# Altium schematic symbol library 724452_RPL-HX_Mobile_AEP_Rev0p91_Library.SchLib: 162 symbols (part 1 of 5) (continued)
## C_MP2950 (continued)

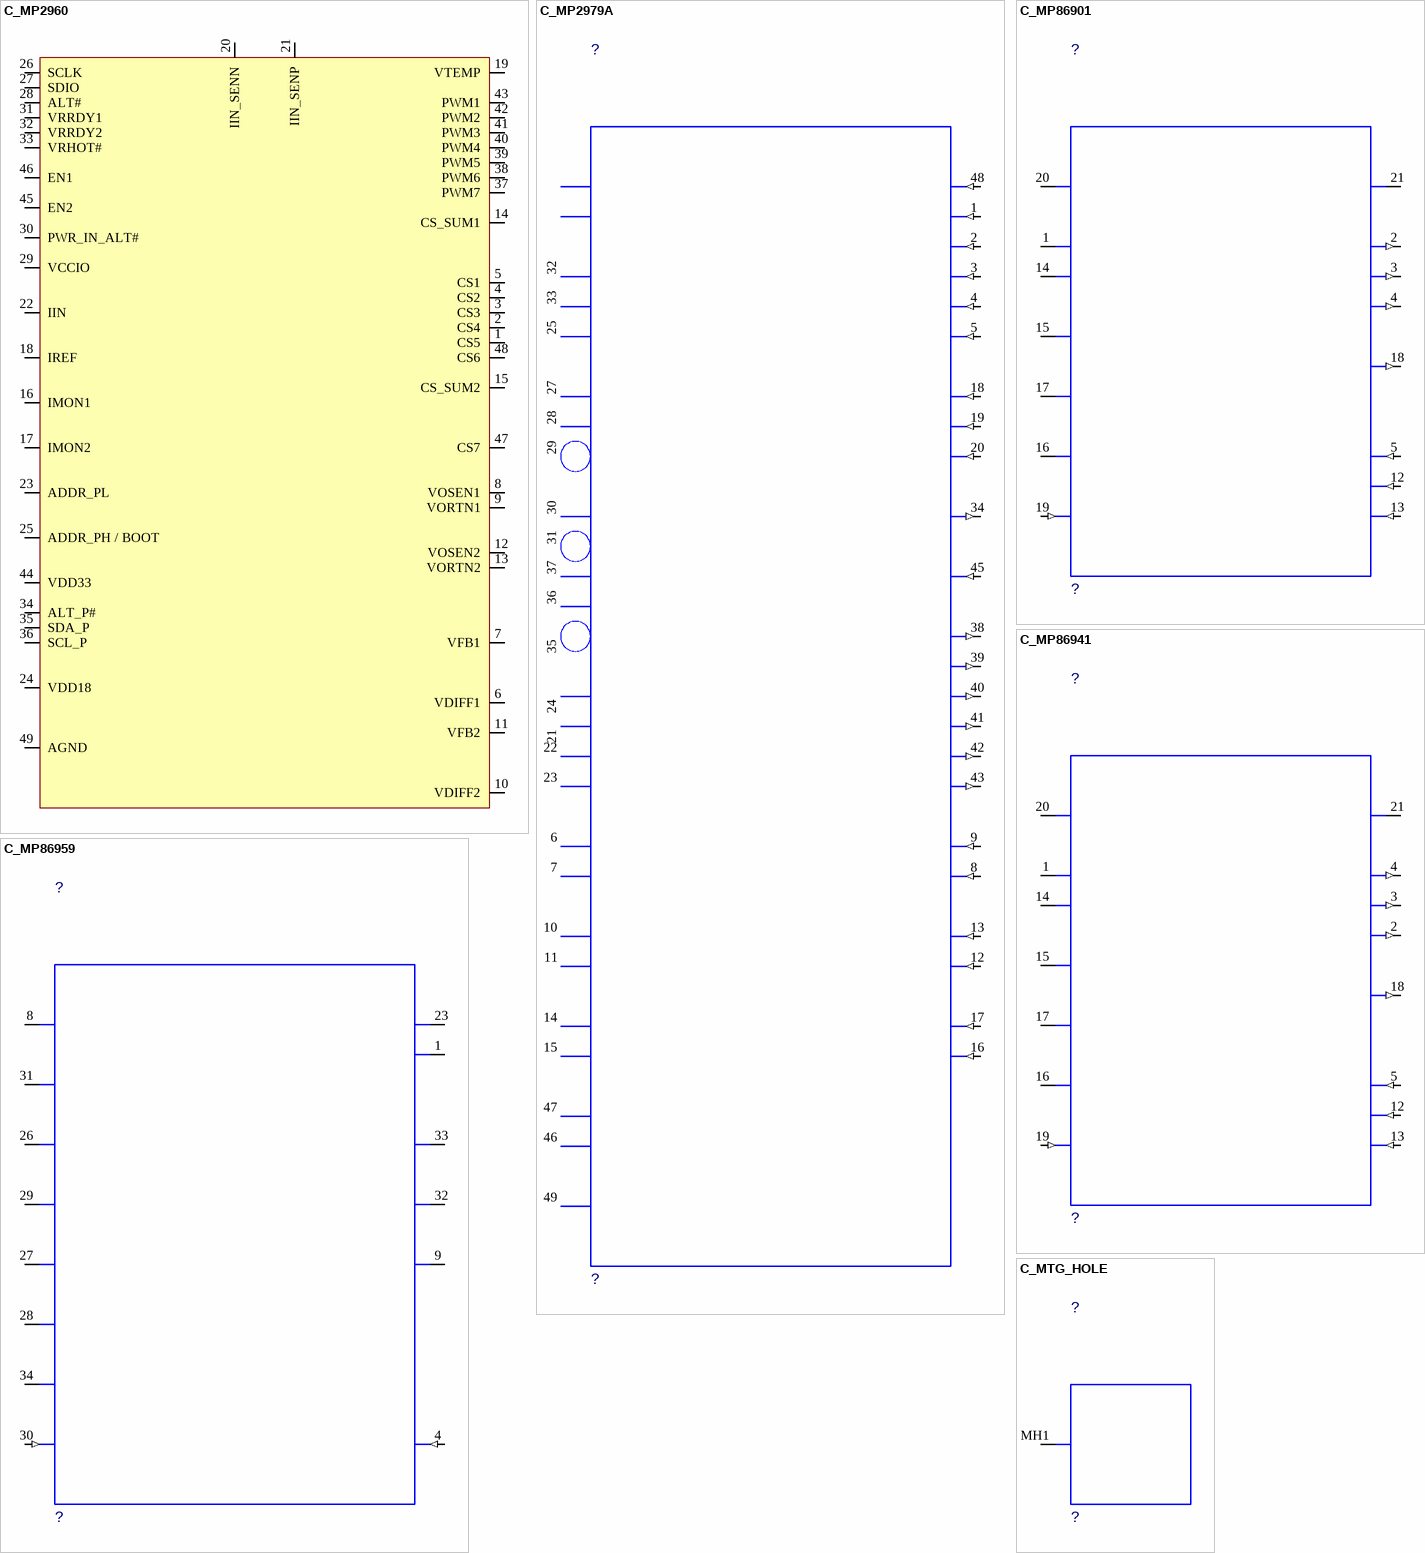
[diagram p11: symbols C_MP2960 to C_MTG_HOLE]

## C_MP2960
designator ?  (value not drawn)
Manufacturer Part Number: MP2965GQK; Case/Package: QFN-48 (6mmx6mm)
pins: 1 CS5, 2 CS4, 3 CS3, 4 CS2, 5 CS1, 6 VDIFF1, 7 VFB1, 8 VOSEN1, 9 VORTN1, 10 VDIFF2, 11 VFB2, 12 VOSEN2, 13 VORTN2, 14 CS_SUM1, 15 CS_SUM2, 16 IMON1, 17 IMON2, 18 IREF, 19 VTEMP, 20 IIN_SENN, 21 IIN_SENP, 22 IIN, 23 ADDR_PL, 24 VDD18, 25 ADDR_PH / BOOT, 26 SCLK, 27 SDIO, 28 ALT#, 29 VCCIO, 30 PWR_IN_ALT#, 31 VRRDY1, 32 VRRDY2, 33 VRHOT#, 34 ALT_P#, 35 SDA_P, 36 SCL_P, 37 PWM7, 38 PWM6, 39 PWM5, 40 PWM4, 41 PWM3, 42 PWM2, 43 PWM1, 44 VDD33, 45 EN2, 46 EN1, 47 CS7, 48 CS6, 49 AGND

## C_MP2979A
designator ?  (value not drawn)
CDS_LMAN_SYM_OUTLINE: -300,950,300,-950; ROOM: NONE; OriginalSymbolOrigin: (-350,950); FP_TECH: ?; IP: ?; PACK_TYPE: ?; VARIANT: ?; MATERIAL: ?; PART_NUMBER: ?
pins: 1 CS5 (in), 2 CS4 (in), 3 CS3 (in), 4 CS2 (in), 5 CS1 (in), 6 VDIFFA (out), 7 VFBA (io), 8 VOSENA (in), 9 VORTNA (in), 10 VDIFFB (out), 11 VFBB (io), 12 VOSENB (in), 13 VORTNB (in), 14 VDIFFC (out), 15 VFBC (io), 16 VOSENC (in), 17 VORTNC (in), 18 CS_SUMA (in), 19 CS_SUMB (in), 20 CS_SUMC (in), 21 IMONA (io), 22 IMONB (io), 23 IMONC (io), 24 IREF (io), 25 ADDR_P (io), 26 VDD18 (power) hidden to VDD18, 27 SCLK (in), 28 SDIO (io), 29 ALT_N (out), 30 VRRDY (out), 31 VRHOT_N (out), 32 SDA_P (io), 33 SCL_P (in), 34 STB (out), 35 SLP_S0_N (in), 36 PE (in), 37 EN (in), 38 PWM6 (out), 39 PWM5 (out), 40 PWM4 (out), 41 PWM3 (out), 42 PWM2 (out), 43 PWM1 (out), 44 VDD33 (power) hidden to VDD33, 45 TEMP (in), 46 PSYS (in), 47 VIN_SEN (in), 48 CS6 (in), 49 AGND_TPD (in)

## C_MP86901
designator ?  (value not drawn)
CDS_LMAN_SYM_OUTLINE: -250,400,250,-350; ROOM: NONE; OriginalSymbolOrigin: (-275,400); FP_TECH: ?; IP: ?; MATERIAL: ?; PACK_TYPE: ?; PART_NUMBER: ?; VARIANT: ?
pins: 1 VIN_1 (power), 2 SW_1 (out), 3 SW_2 (out), 4 SW_3 (out), 5 PGND_1 (in), 12 PGND_2 (in), 13 PGND_3 (in), 14 VIN_2 (power), 15 PWM (io), 16 SYNC (io), 17 VTEMP_FLT (io), 18 CS (out), 19 AGND (in), 20 VCC (power), 21 BST (io)

## C_MP86941
designator ?  (value not drawn)
CDS_LMAN_SYM_OUTLINE: -250,400,250,-350; ROOM: NONE; OriginalSymbolOrigin: (-275,400); FP_TECH: ?; IP: ?; MATERIAL: ?; PACK_TYPE: ?; PART_NUMBER: ?; VARIANT: ?
pins: 1 VIN_1 (power), 2 SW_1 (out), 3 SW_2 (out), 4 SW_3 (out), 5 PGND_1 (in), 12 PGND_2 (in), 13 PGND_3 (in), 14 VIN_2 (power), 15 PWM (io), 16 SYNC (io), 17 VTEMP_FLT (io), 18 CS (out), 19 AGND (in), 20 VCC (power), 21 BST (io)

## C_MP86959
designator ?  (value not drawn)
CDS_LMAN_SYM_OUTLINE: -300,450,300,-450; ROOM: NONE; OriginalSymbolOrigin: (-325,450); FP_TECH: ?; IP: ?; PACK_TYPE: ?; VARIANT: ?; MATERIAL: ?; PART_NUMBER: ?
pins: 1 VIN_1 (power), 4 PGND (in), 8 VDRV (io), 9 SW (io), 23 VIN_2 (power), 26 PWM (io), 27 SYNC (io), 28 CS (io), 29 VTEMP_FLT (io), 30 AGND (in), 31 VDD (power), 32 PHASE (io), 33 BST (io), 34 TEST (io)

## C_MTG_HOLE
designator ?  (value not drawn)
CDS_LMAN_SYM_OUTLINE: -100,100,100,-100; ROOM: NONE; OriginalSymbolOrigin: (-125,100); FP_TECH: ?; IP: ?; MATERIAL: ?; PACK_TYPE: ?; PART_NUMBER: ?; VARIANT: ?
pins: MH1 (io)

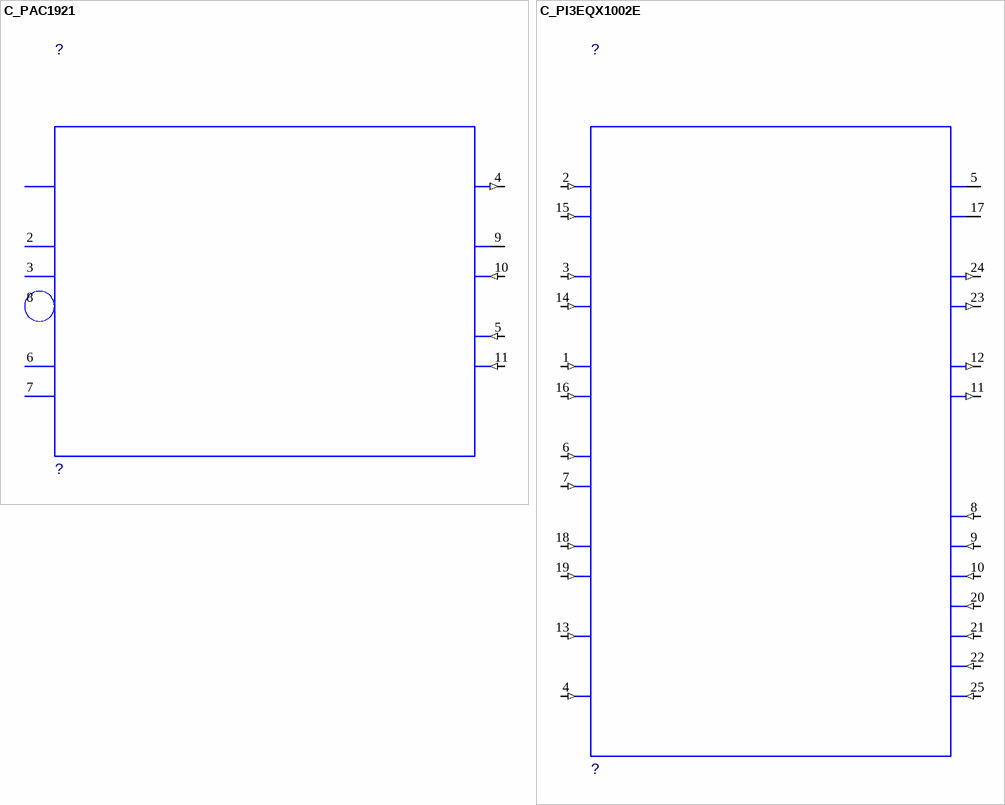
[diagram p12: symbols C_PAC1921 to C_PI3EQX1002E]

## C_PAC1921
designator ?  (value not drawn)
CDS_LMAN_SYM_OUTLINE: -350,250,350,-300; ROOM: NONE; OriginalSymbolOrigin: (-400,250); FP_TECH: ?; IP: ?; MATERIAL: ?; PACK_TYPE: ?; PART_NUMBER: ?; VARIANT: ?
pins: 1 VDD (power) hidden to VDD, 2 SENSE_DP (io), 3 SENSE_DN (io), 4 OUT (out), 5 GND (in), 6 ADDR_SEL (io), 7 RESERVED (io), 8 READ_N_INT (in), 9 SM_DATA (io), 10 SM_CLK (in), 11 THPAD (in)

## C_PI3EQX1002E
designator ?  (value not drawn)
CDS_LMAN_SYM_OUTLINE: -300,550,300,-500; ROOM: NONE; OriginalSymbolOrigin: (-325,550); FP_TECH: ?; IP: ?; MATERIAL: ?; PACK_TYPE: ?; PART_NUMBER: ?; VARIANT: ?
pins: 1 EQA (in), 2 FGA (in), 3 SWA (in), 4 EN (in), 5 VDD_1 (power), 6 AIP (in), 7 AIN (in), 8 GND_1 (in), 9 GND_2 (in), 10 GND_3 (in), 11 BON (out), 12 BOP (out), 13 RXDET_EN (in), 14 SWB (in), 15 FGB (in), 16 EQB (in), 17 VDD_2 (power), 18 BIP (in), 19 BIN (in), 20 GND_4 (in), 21 GND_5 (in), 22 GND_6 (in), 23 AON (out), 24 AOP (out), 25 GND_TPD (in)

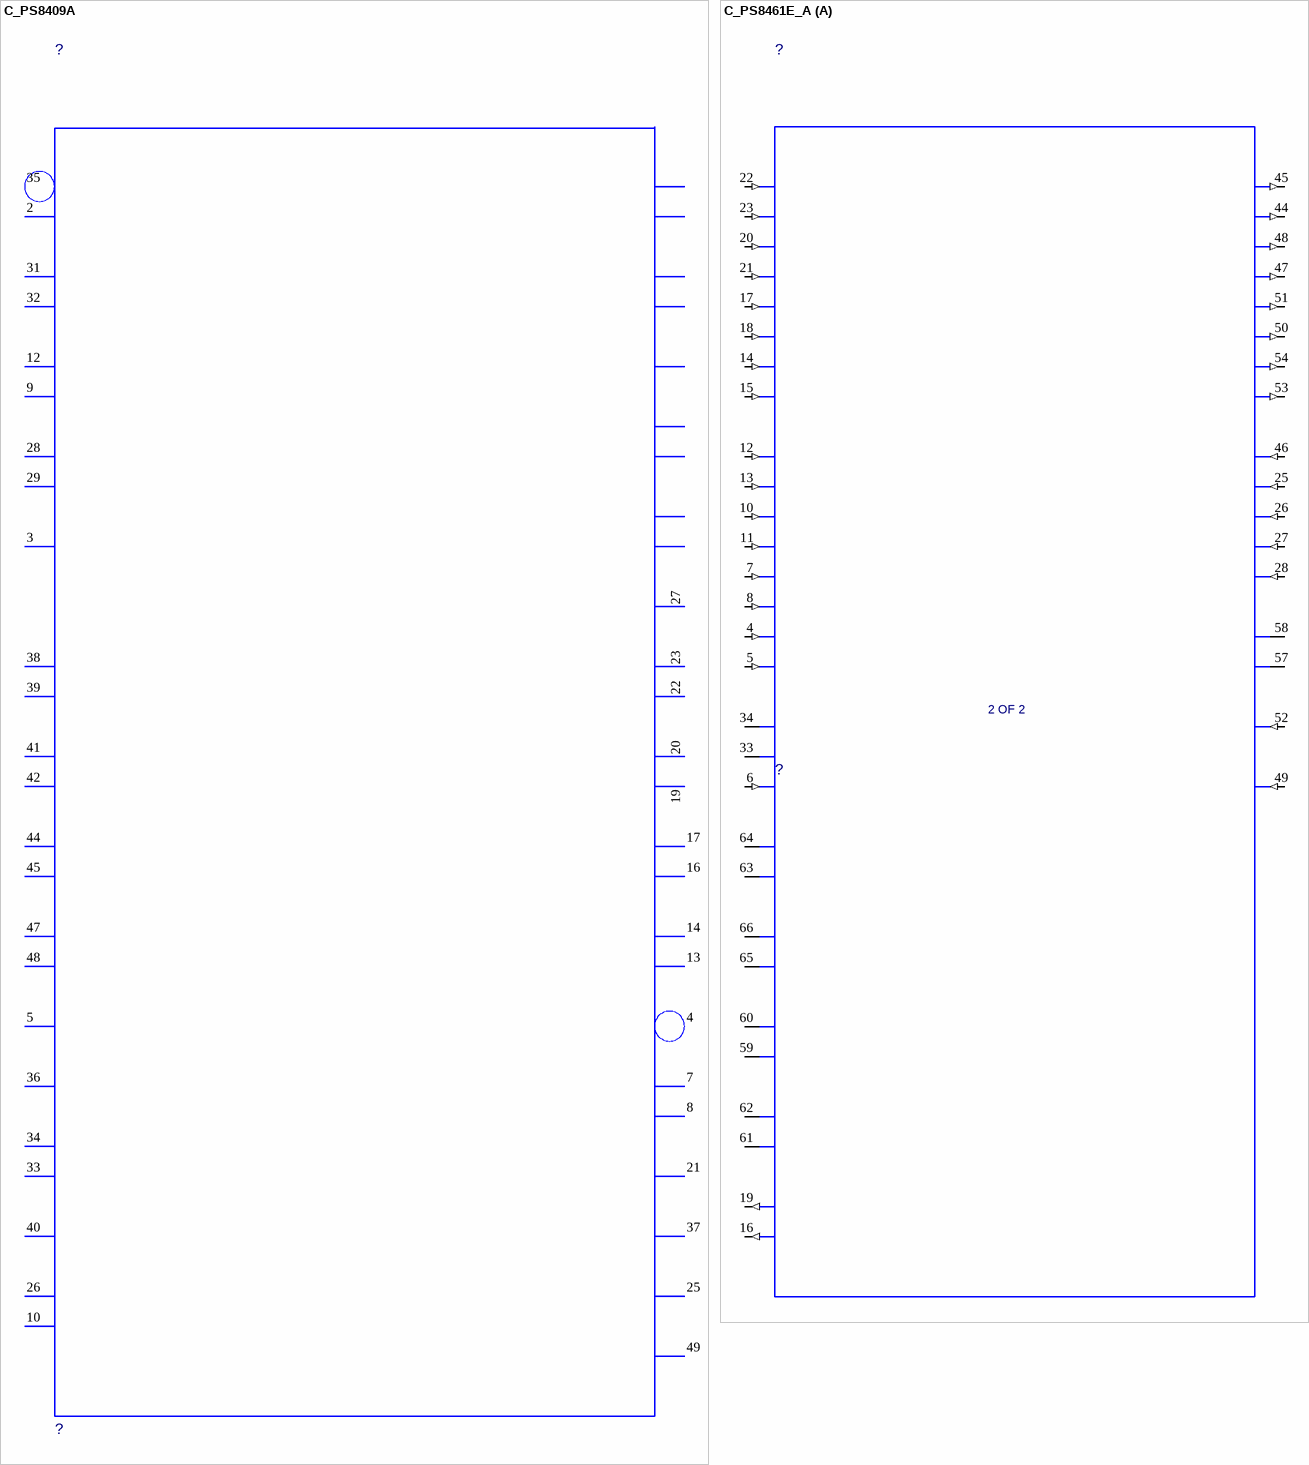
[diagram p13: symbols C_PS8409A to C_PS8461E_A]

## C_PS8409A
designator ?  (value not drawn)
CDS_LMAN_SYM_OUTLINE: -500,1050,500,-1100; ROOM: NONE; OriginalSymbolOrigin: (-550,1050); FP_TECH: ?; IP: ?; MATERIAL: ?; PACK_TYPE: ?; PART_NUMBER: ?; VARIANT: ?
pins: 1 VDD33_1 (power) hidden to VDD33_1, 2 TESTMODEB (in), 3 DCIN_ENB (in), 4 PDB (in), 5 EQ (in), 6 VDD12_1 (power) hidden to VDD12_1, 7 SCL_SNK (io), 8 SDA_SNK (io), 9 HDMI_CEC (io), 10 RSV1 (io), 11 VDDA12 (power) hidden to VDDA12, 12 CEC_EN (out), 13 OUT_CLKN (out), 14 OUT_CLKP (out), 15 VDDTX12_1 (power) hidden to VDDTX12_1, 16 OUT_D0N (out), 17 OUT_D0P (out), 18 VDDTX12_2 (power) hidden to VDDTX12_2, 19 OUT_D1N (out), 20 OUT_D1P (out), 21 HPD_SNK (in), 22 OUT_D2N (out), 23 OUT_D2P (out), 24 VDD33_2 (power) hidden to VDD33_2, 25 NC (io), 26 RSV2 (io), 27 PRE (in), 28 CSDA (io), 29 CSCL (io), 30 VDD12_2 (power) hidden to VDD12_2, 31 I2C_ADDR (in), 32 HDMI_ID (in), 33 SDA_SRC_AUXN (io), 34 SCL_SRC_AUXP (io), 35 RESETB (in), 36 REXT (in), 37 POWERSWITCH (out), 38 IN_D2P (in), 39 IN_D2N (in), 40 HPD_SRC (out), 41 IN_D1P (in), 42 IN_D1N (in), 43 VDDRX12_1 (power) hidden to VDDRX12_1, 44 IN_D0P (in), 45 IN_D0N (in), 46 VDDRX12_2 (power) hidden to VDDRX12_2, 47 IN_CLKP (in), 48 IN_CLKN (in), 49 THPAD (in)

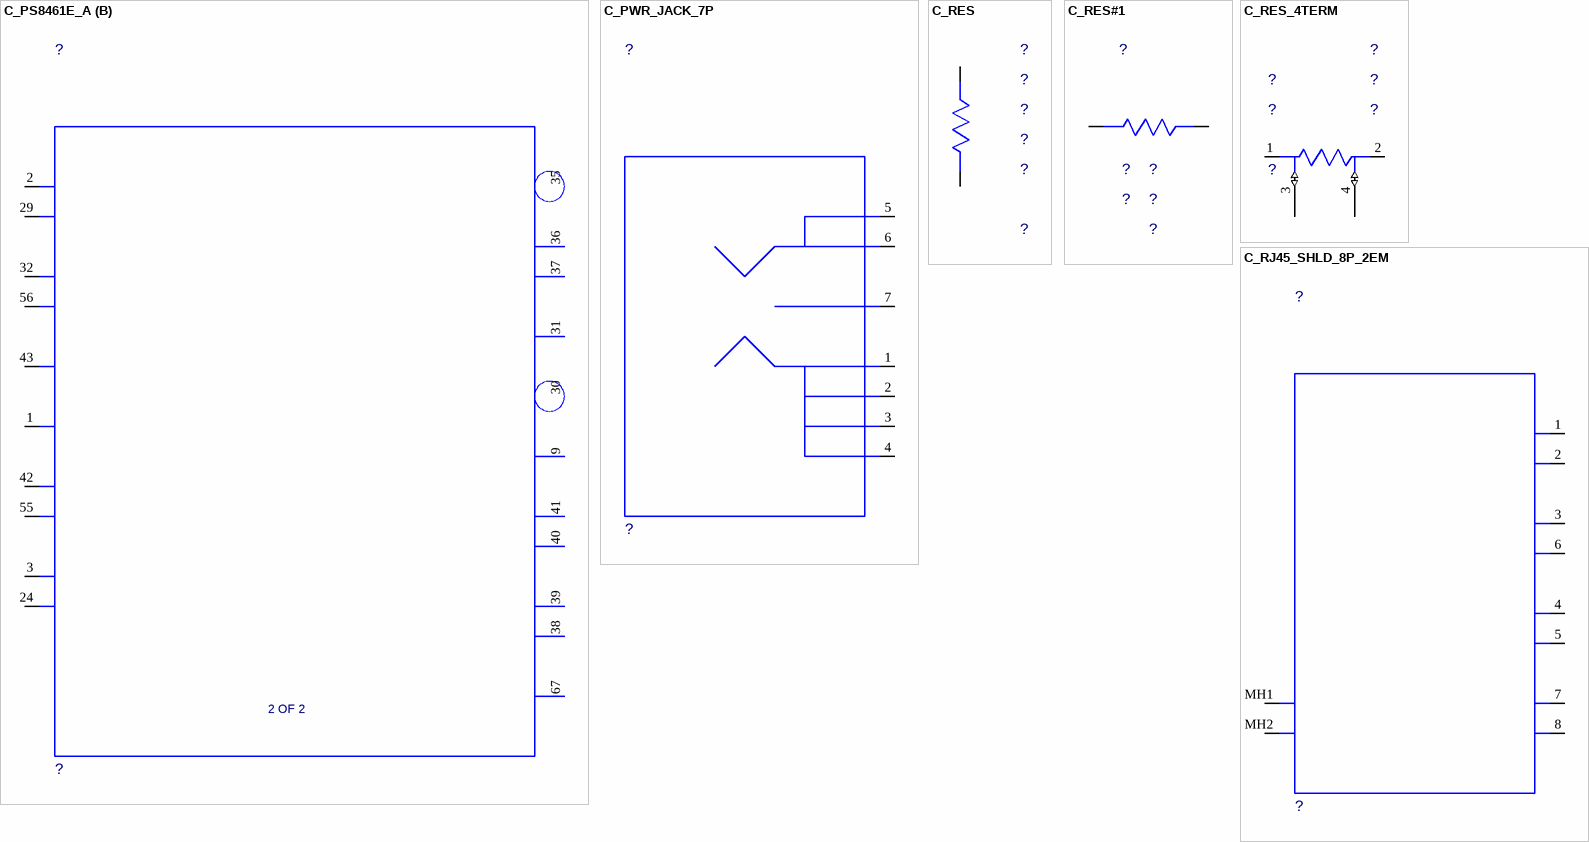
[diagram p14: symbols C_PS8461E_A to C_RJ45_SHLD_8P_2EM]

## C_PS8461E_A
designator ?  PART_SYM_NUM: 2 OF 2  (hidden comment: C_PS8461E_A)
CDS_LMAN_SYM_OUTLINE: -400,500,400,-550; ROOM: NONE; OriginalSymbolOrigin: (-425,500); FP_TECH: ?; IP: ?; PACK_TYPE: ?; VARIANT: ?; MATERIAL: ?; PART_NUMBER: ?
part A pins: 4 IN1_D0P (in), 5 IN1_D0N (in), 6 I2C_ADDR (in), 7 IN1_D1P (in), 8 IN1_D1N (in), 10 IN1_D2P (in), 11 IN1_D2N (in), 12 IN1_D3P (in), 13 IN1_D3N (in), 14 IN2_D0P (in), 15 IN2_D0N (in), 16 IN1_HPD (out), 17 IN2_D1P (in), 18 IN2_D1N (in), 19 IN2_HPD (out), 20 IN2_D2P (in), 21 IN2_D2N (in), 22 IN2_D3P (in), 23 IN2_D3N (in), 25 CFG3 (in), 26 CFG2 (in), 27 CFG1 (in), 28 CFG0 (in), 33 CSDA (io), 34 CSCL (io), 44 OUT_D3N (out), 45 OUT_D3P (out), 46 CFG4 (in), 47 OUT_D2N (out), 48 OUT_D2P (out), 49 OUT_HPD (in), 50 OUT_D1N (out), 51 OUT_D1P (out), 52 DP_CADET (in), 53 OUT_D0N (out), 54 OUT_D0P (out), 57 DP_AUXN_SDA (io), 58 DP_AUXP_SCL (io), 59 IN2_AUXN (io), 60 IN2_AUXP (io), 61 IN1_AUXN (io), 62 IN1_AUXP (io), 63 IN2_SDA (io), 64 IN2_SCL (io), 65 IN1_SDA (io), 66 IN1_SCL (io)
part B pins: 1 VDD_DDC (power), 2 VDD33_1 (power), 3 VDDRX12_1 (power), 9 SW (io), 24 VDDRX12_2 (power), 29 VDD33_2 (power), 30 PD_N (in), 31 REXT (io), 32 VDD12_1 (power), 35 AUX_CFG_N (in), 36 RSV1 (io), 37 RSV0 (io), 38 IN2_EQ0 (in), 39 IN2_EQ1 (in), 40 IN1_EQ0 (in), 41 IN1_EQ1 (in), 42 VDDTX12_1 (power), 43 VDDA12 (power), 55 VDDTX12_2 (power), 56 VDD12_2 (power), 67 THPAD (in)

## C_PWR_JACK_7P
designator ?  (value not drawn)
CDS_LMAN_SYM_OUTLINE: -200,300,200,-300; ROOM: NONE; OriginalSymbolOrigin: (-200,300); FP_TECH: ?; IP: ?; MATERIAL: ?; PACK_TYPE: ?; PART_NUMBER: ?; VARIANT: ?
pins: 1 SHELL_M_1 (io), 2 SHELL_M_2 (io), 3 SHELL_M_3 (io), 4 SHELL_M_4 (io), 5 SPRING_P_1 (io), 6 SPRING_P_2 (io), 7 ID (io)

## C_RES
designator ?, comment ?
CDS_LMAN_SYM_OUTLINE: -50,50,50,-50; ROOM: NONE; OriginalSymbolOrigin: (-25,75); FP_TECH: ?; IP: ?; MATERIAL: ?; PACK_TYPE: ?; PART_NUMBER: ?; TOLERANCE: ?; VARIANT: ?; WATTAGE: ?
pins: 1 A (io), 2 B (io)

## C_RES#1
designator ?, comment ?
CDS_LMAN_SYM_OUTLINE: -50,50,50,-50; ROOM: NONE; OriginalSymbolOrigin: (-75,25); FP_TECH: ?; IP: ?; MATERIAL: ?; PACK_TYPE: ?; PART_NUMBER: ?; TOLERANCE: ?; VARIANT: ?; WATTAGE: ?
pins: 1 A (io), 2 B (io)

## C_RES_4TERM
designator ?, comment ?
CDS_LMAN_SYM_OUTLINE: -50,50,50,-50; ROOM: NONE; OriginalSymbolOrigin: (-75,25); FP_TECH: ?; IP: ?; MATERIAL: ?; PACK_TYPE: ?; PART_NUMBER: ?; TOLERANCE: ?; VARIANT: ?; WATTAGE: ?
pins: 1 PWRA (io), 2 PWRB (io), 3 SENA (io), 4 SENB (io)

## C_RJ45_SHLD_8P_2EM
designator ?  (value not drawn)
CDS_LMAN_SYM_OUTLINE: -200,350,200,-350; ROOM: NONE; OriginalSymbolOrigin: (-225,350); FP_TECH: ?; IP: ?; PACK_TYPE: ?; VARIANT: ?; MATERIAL: ?; PART_NUMBER: ?
pins: 1 TX1_DP (io), 2 TX1_DN (io), 3 TX2_DP (io), 4 TX3_DP (io), 5 TX3_DN (io), 6 TX2_DN (io), 7 TX4_DP (io), 8 TX4_DN (io), MH1 (io), MH2 (io)

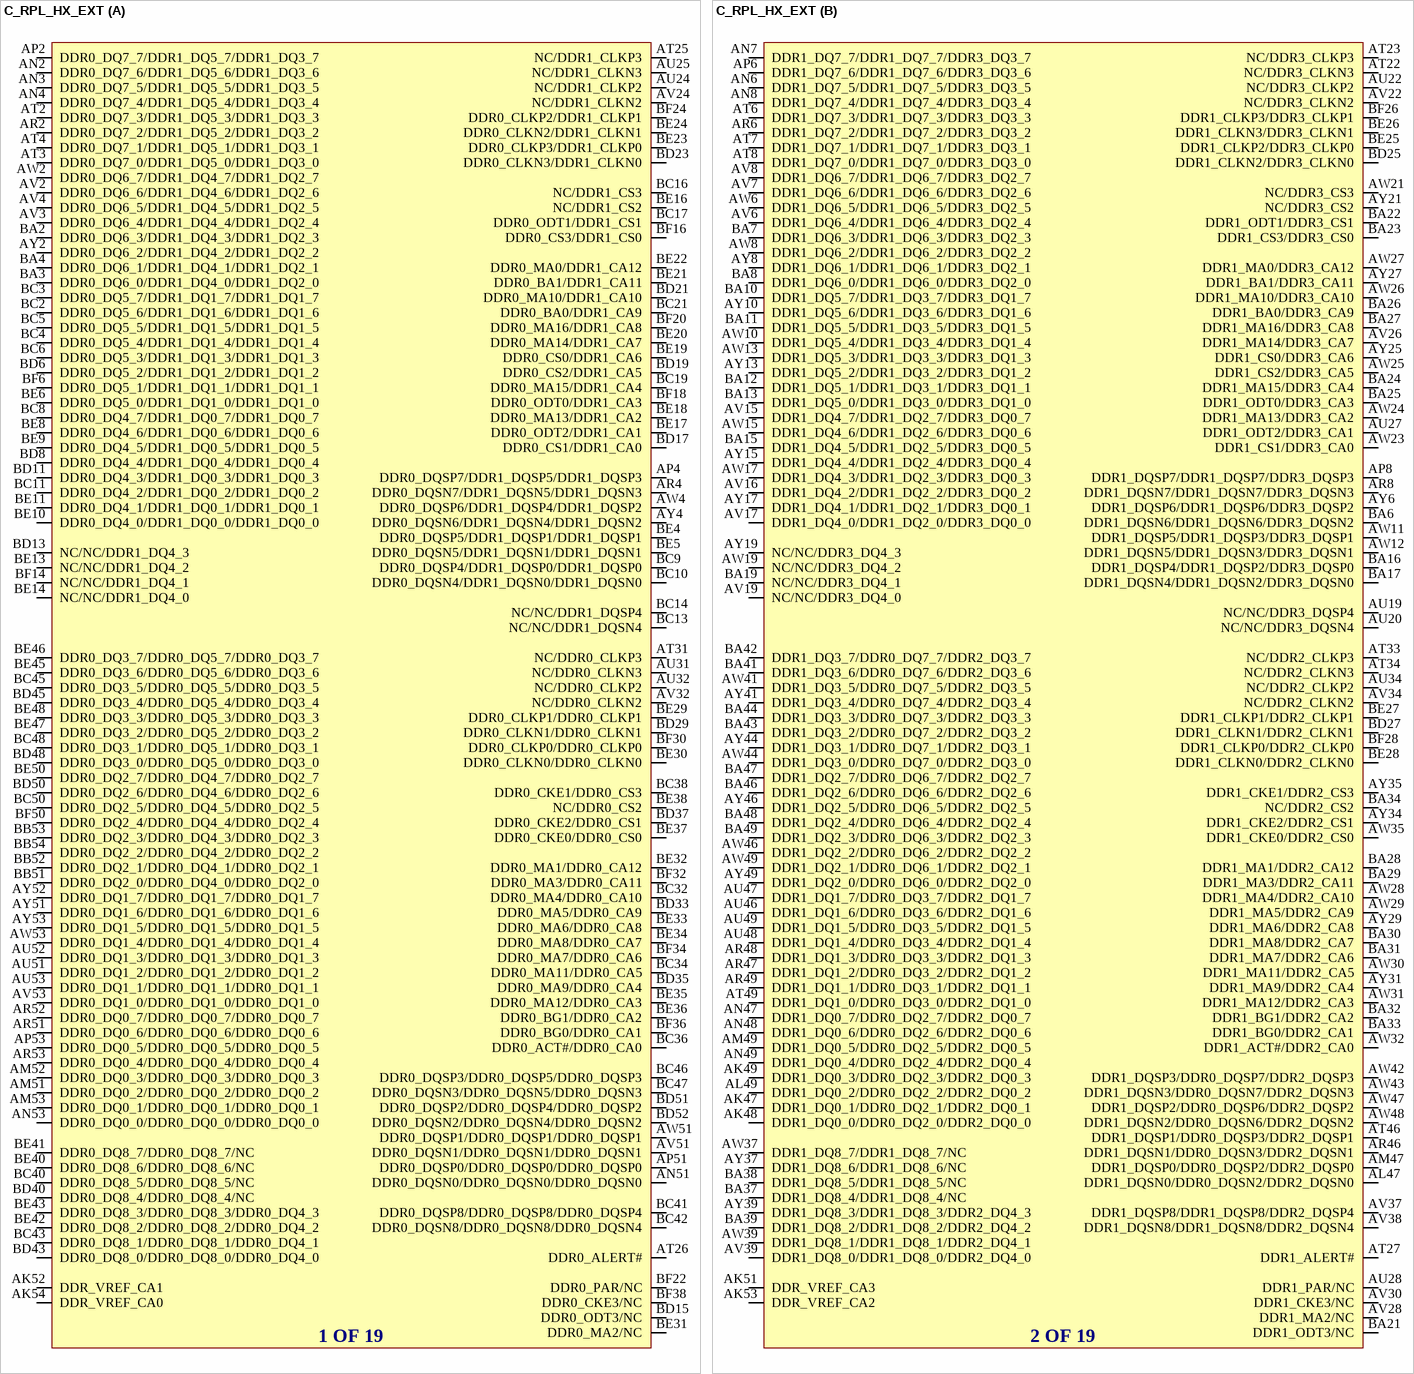
[diagram p15: symbol C_RPL_HX_EXT]

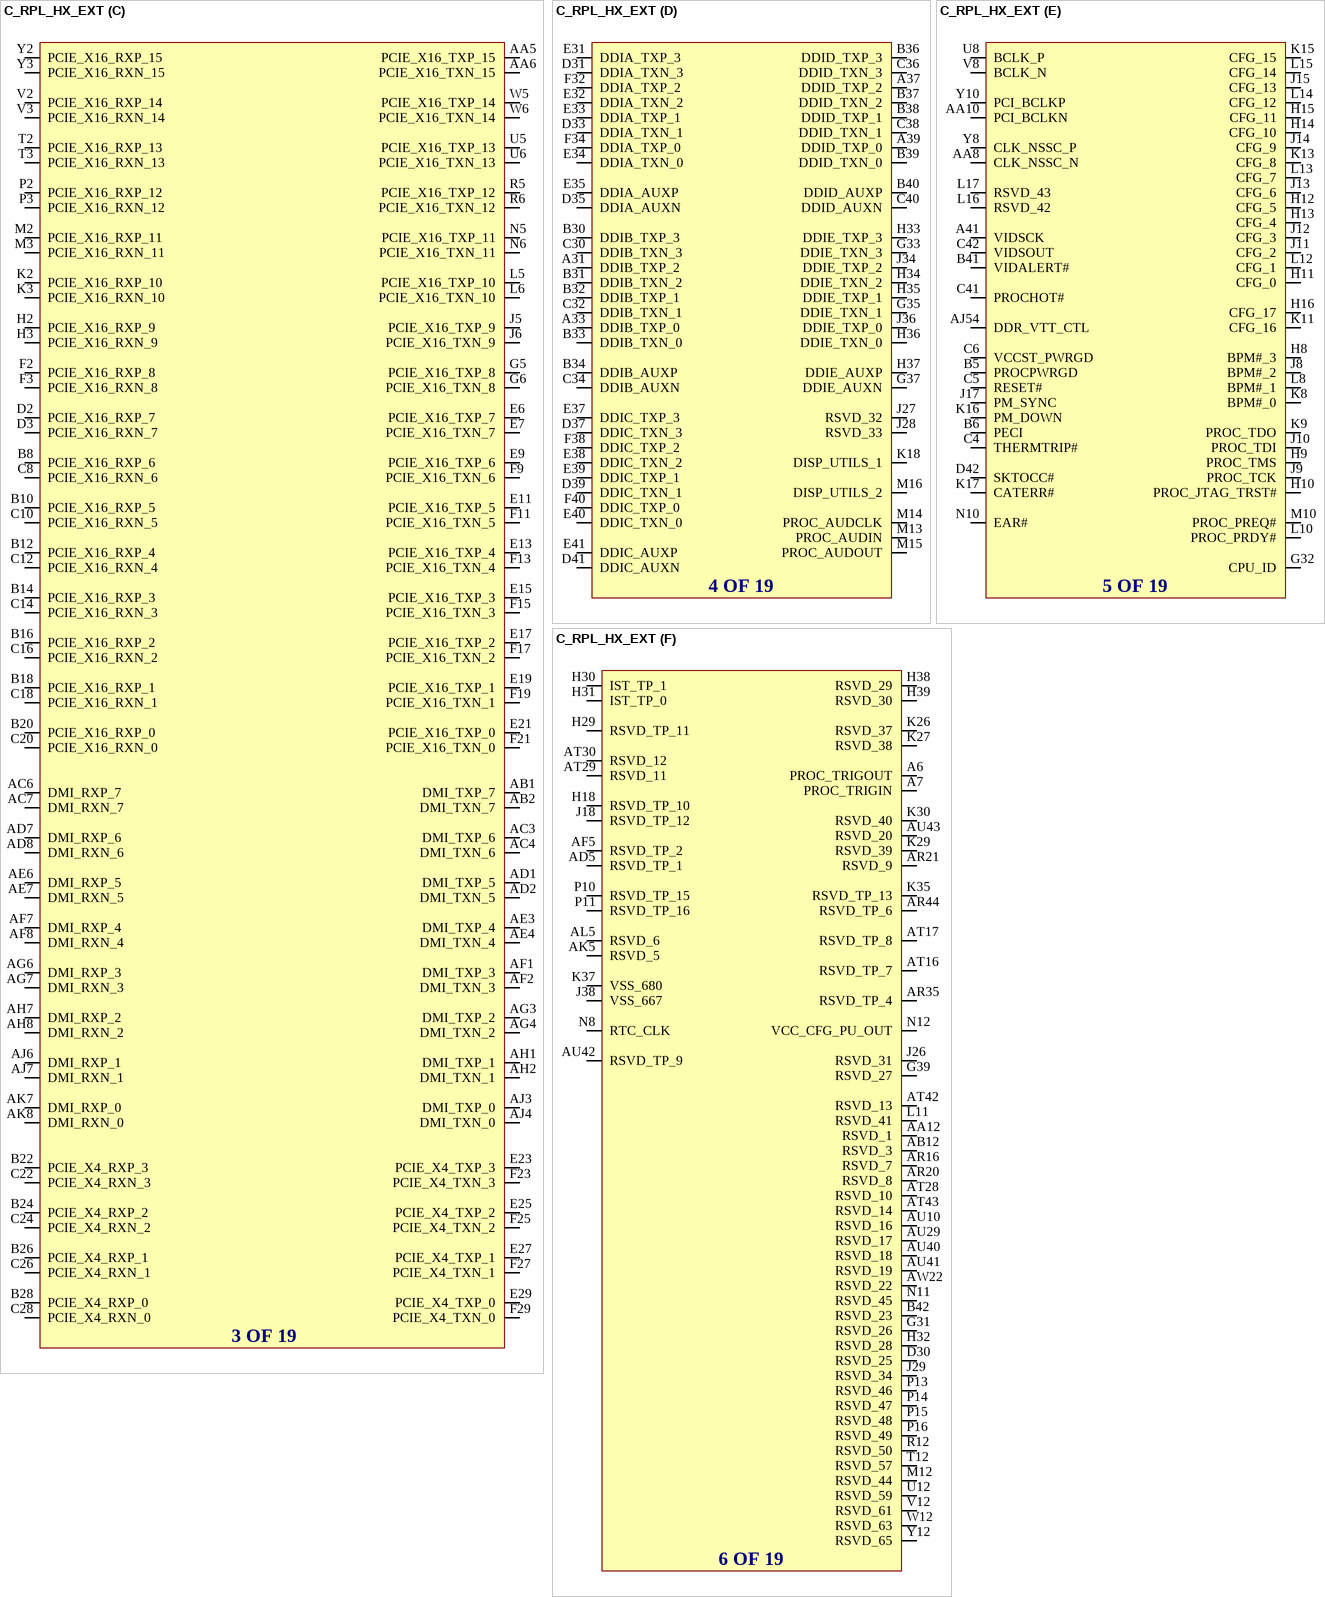
[diagram p16: symbol C_RPL_HX_EXT]

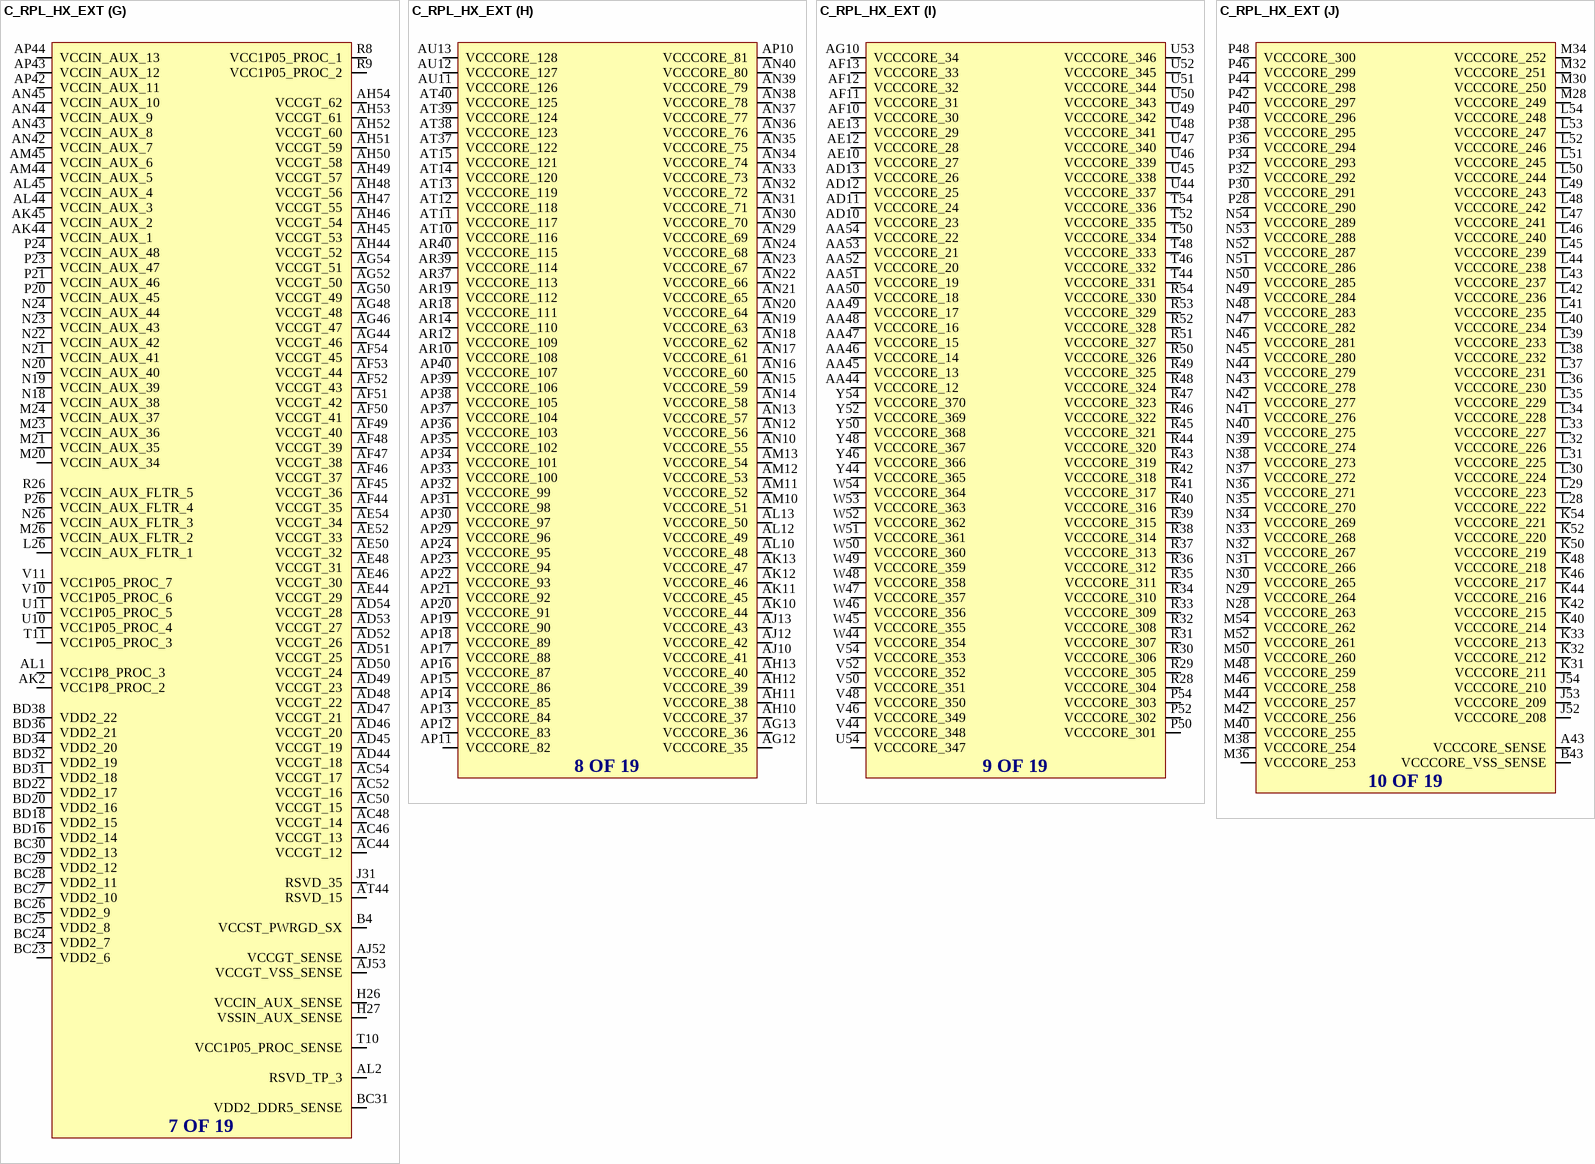
[diagram p17: symbol C_RPL_HX_EXT]

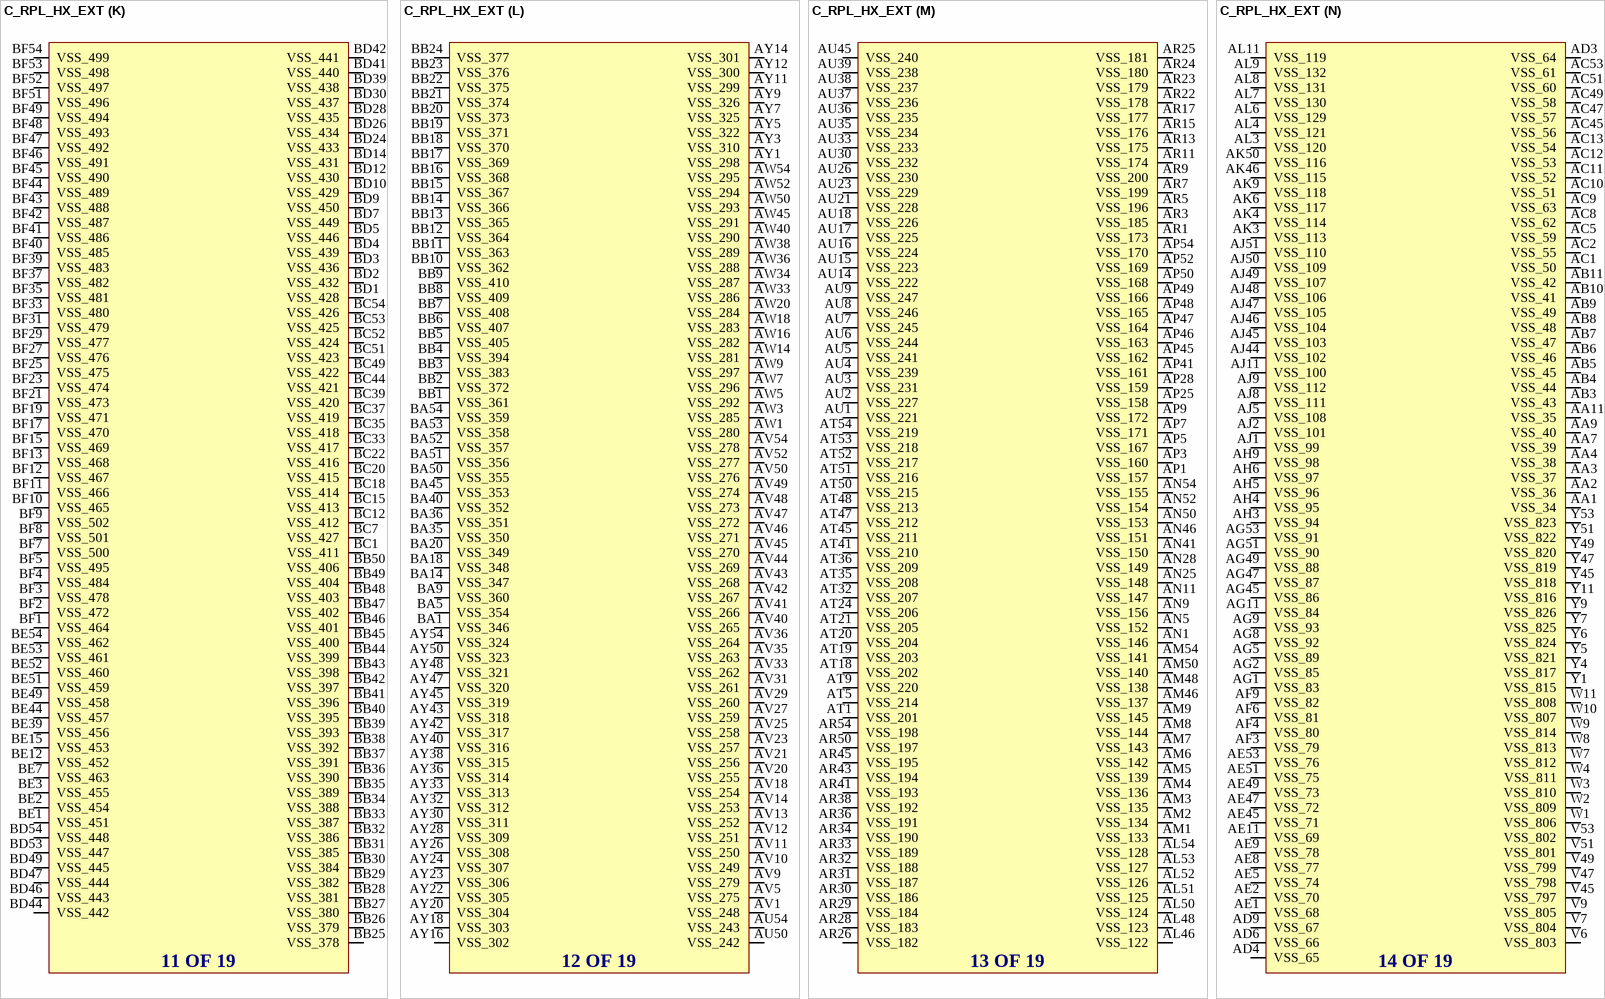
[diagram p18: symbol C_RPL_HX_EXT]

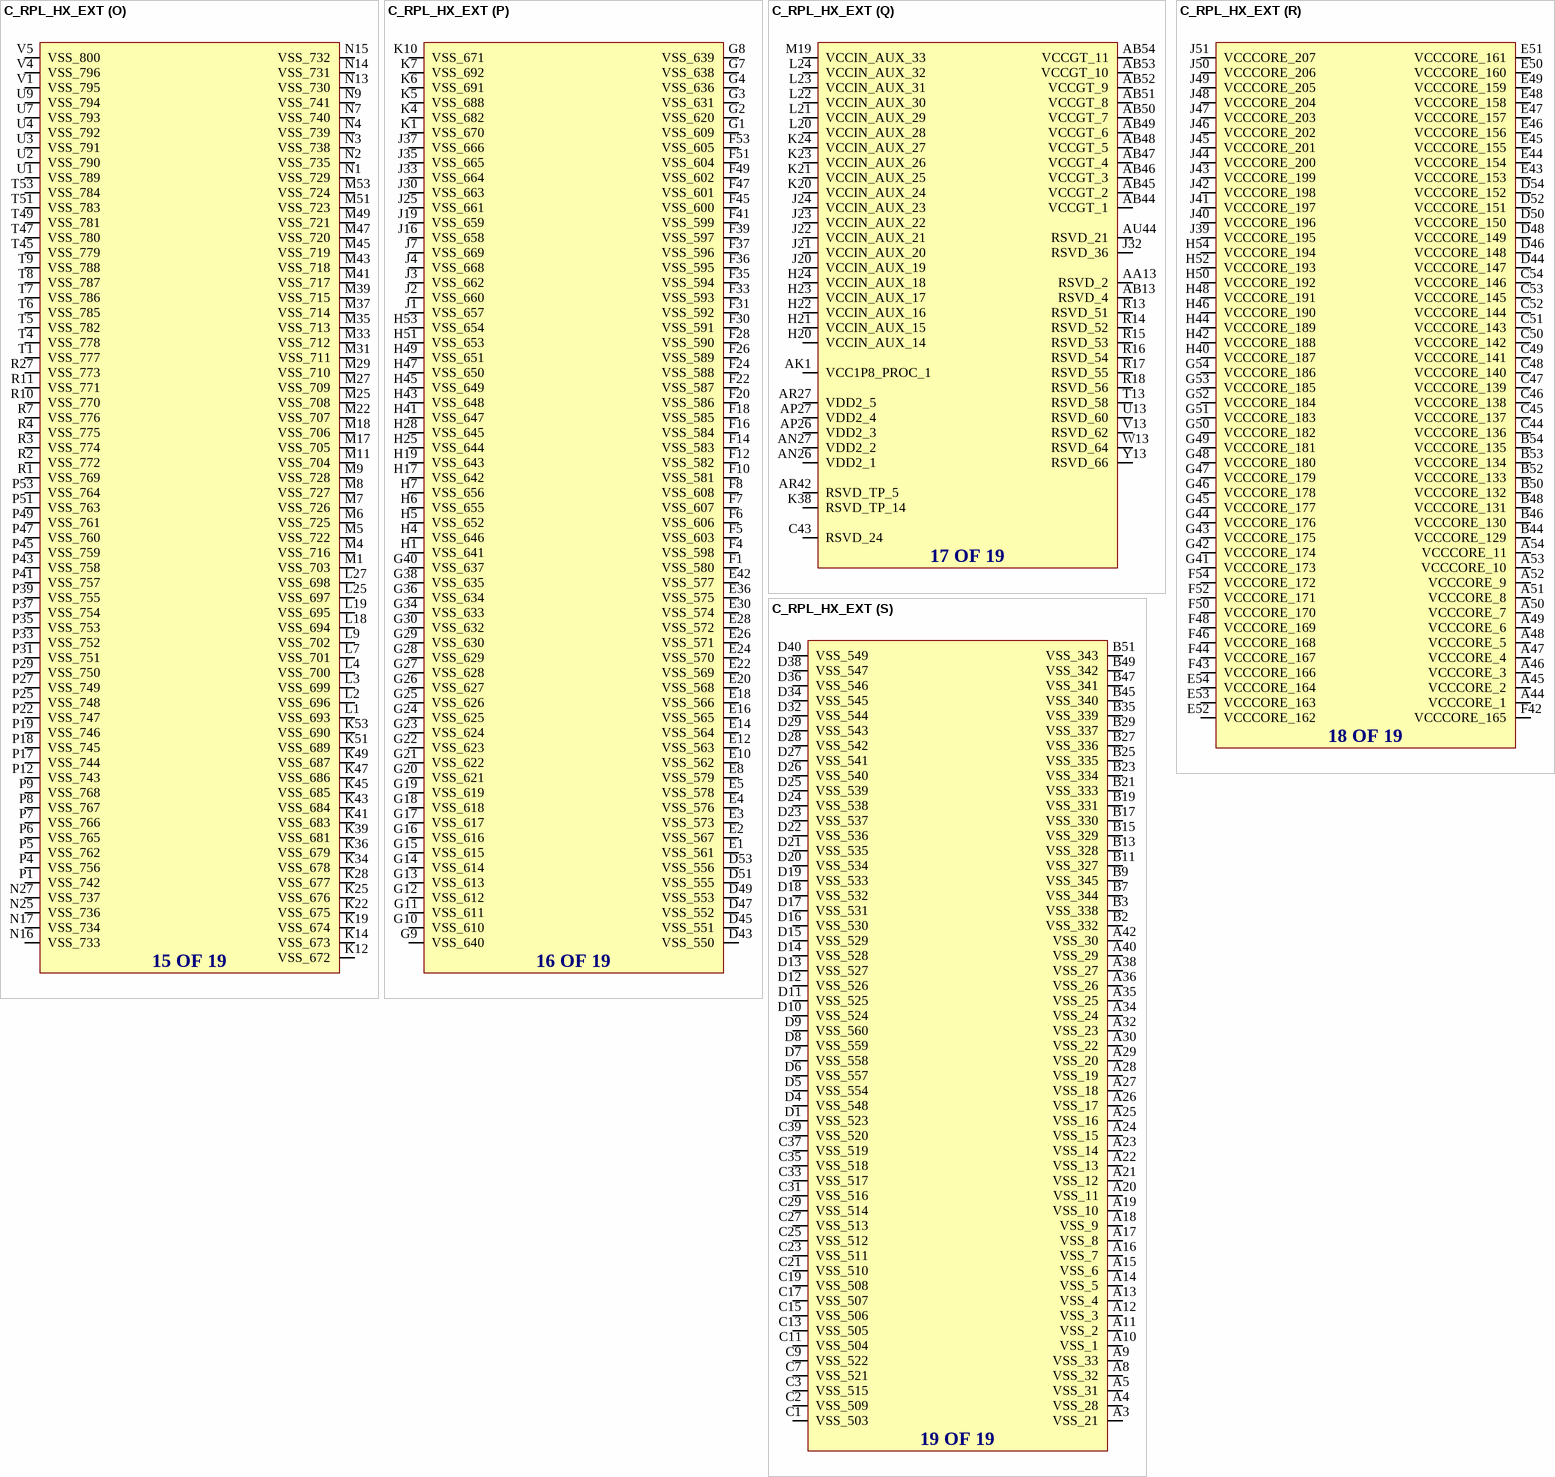
[diagram p19: symbol C_RPL_HX_EXT]